# Altium footprint library Connector_art.PcbLib: 209 footprints (part 1 of 14)
Each footprint in its own frame and in the unit in brackets; x right, y up, seen from the top. Pads: shape width x height; smd on the part's side, far side on the other; paste and mask are expansions set on the pad; w line width, h text height; cw(c..) or ccw(c..) is an arc to the next point about the centre after c.
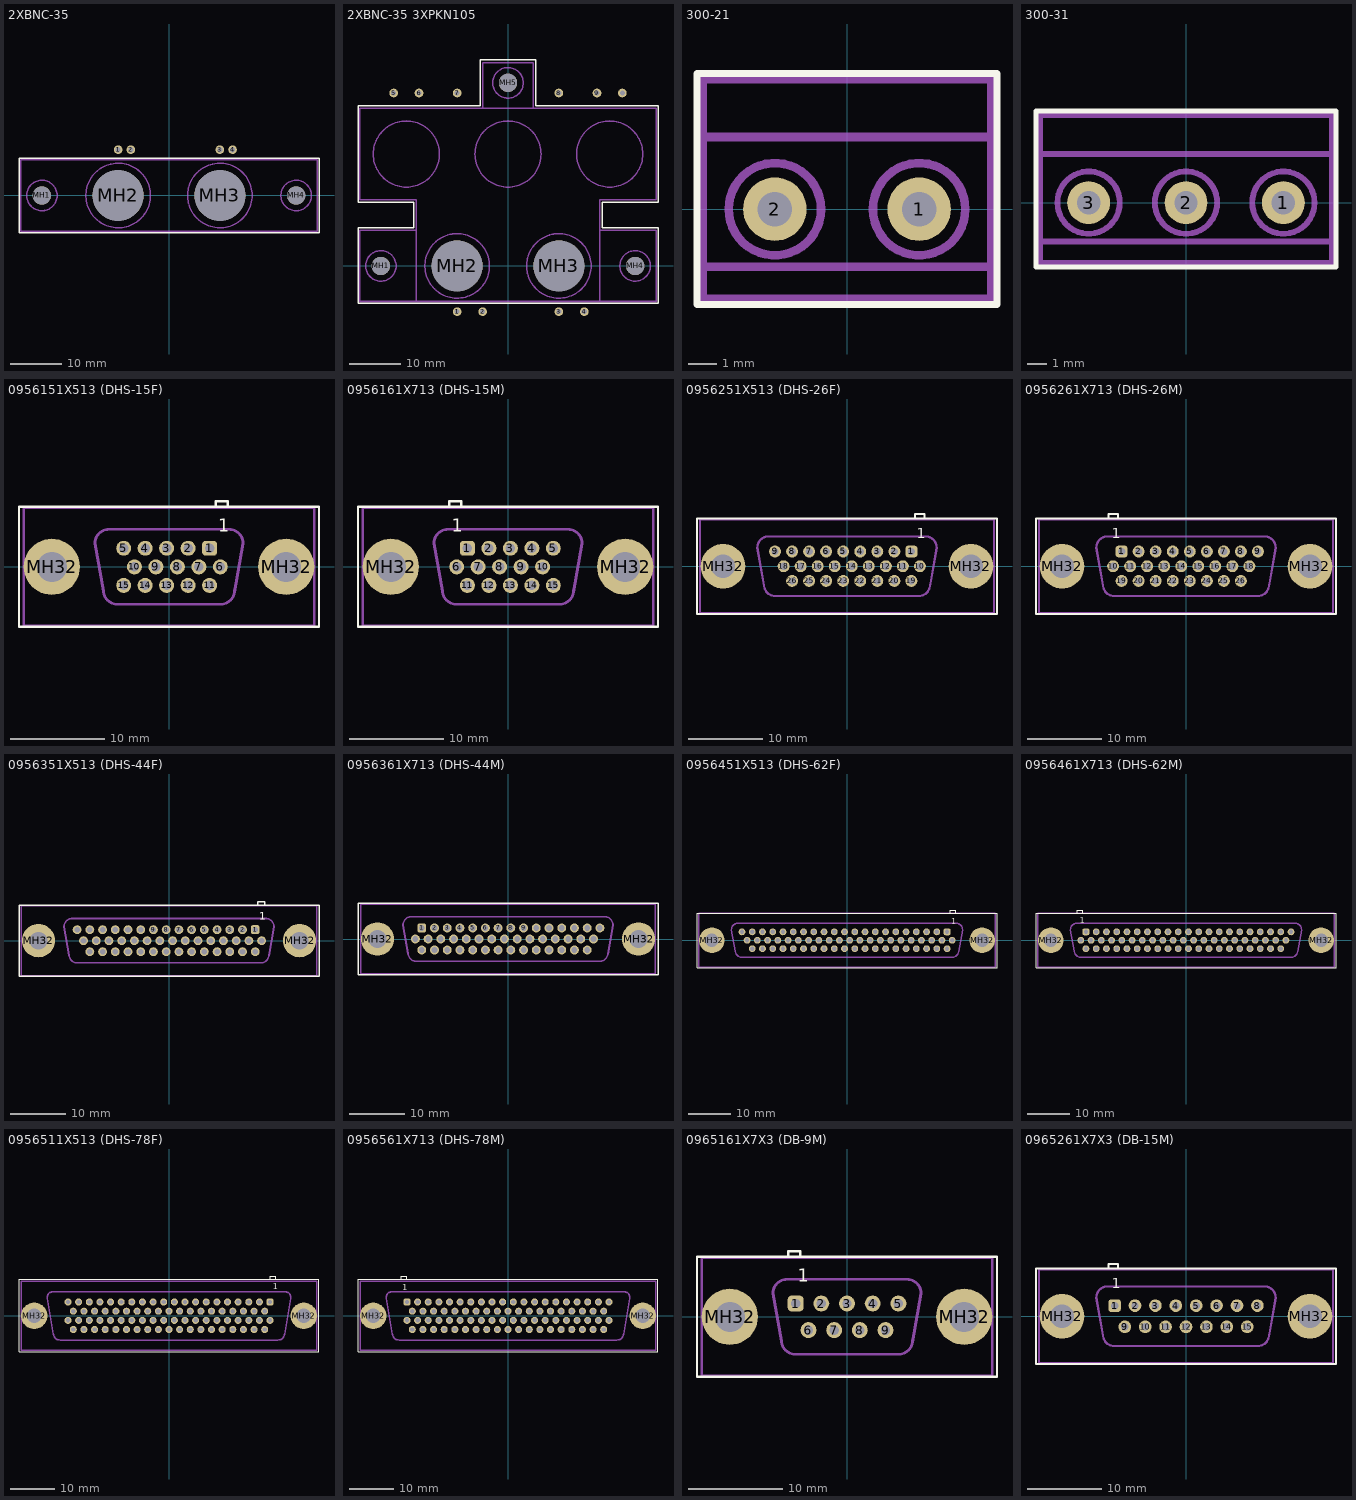
[diagram p0: the footprints below, top view; thin cyan lines are the x and y axes]

## 2XBNC-35 [mm]
height 18
pads (8):
  round 1.7 hole 1: 1(-10,9) 2(-7.5,9) 3(10,9) 4(12.5,9)
  round 3.6 hole 3.6 unplated: MH1(-25,0) MH4(25,0)
  round 10 hole 10 unplated: MH2(-10,0) MH3(10,0)
Top Overlay:
  lines w0.25: -29.5,-7.3 -29.5,7.3 29.5,7.3 29.5,-7.3 -29.5,-7.3
Mechanical 1:
  circle w0.3: c-10,0 r6.35
  circle w0.3: c10,0 r6.35
  circle w0.3: c-25,0 r3
  circle w0.3: c25,0 r3
  lines w0.3: -29.2,-7 29.2,-7 29.2,7 -29.2,7 -29.2,-7
3D body: height 18, standoff -9.6, extent -29.204,-6.997 29.196,7.003

## 2XBNC-35 3XPKN105 [mm]
height 18
pads (15):
  round 1.7 hole 1: 1(-10,-9) 2(-5,-9) 3(10,-9) 4(15,-9) 5(-22.5,34) 6(-17.5,34) 7(-10,34) 8(10,34) 9(17.5,34) 10(22.5,34)
  round 3.6 hole 3.6 unplated: MH1(-25,0) MH4(25,0) MH5(0,36)
  round 10 hole 10 unplated: MH2(-10,0) MH3(10,0)
Top Overlay:
  lines w0.25: -29.5,-7.3 29.5,-7.3 29.5,7.5 18.5,7.5 18.5,12.5 29.5,12.5 29.5,31.5 5.5,31.5 5.5,40.5 -5.5,40.5 -5.5,31.5 -29.5,31.5 -29.5,12.5 -18.5,12.5 -18.5,7.5 -29.5,7.5 -29.5,-7.3
Bottom Overlay:
  circle w0.25: c-10,-9 r1.25
  circle w0.25: c-5,-9 r1.25
  circle w0.25: c10,-9 r1.25
  circle w0.25: c15,-9 r1.25
  circle w0.25: c22.5,34 r1.25
  circle w0.25: c17.5,34 r1.25
  circle w0.25: c10,34 r1.25
  circle w0.25: c-22.5,34 r1.25
  circle w0.25: c-17.5,34 r1.25
  circle w0.25: c-10,34 r1.25
Mechanical 1:
  circle w0.3: c-10,0 r6.35
  circle w0.3: c10,0 r6.35
  circle w0.3: c-25,0 r3
  circle w0.3: c25,0 r3
  circle w0.3: c0,36 r3
  circle w0.3: c0,22 r6.5
  circle w0.3: c-20,22 r6.5
  circle w0.3: c20,22 r6.5
  lines w0.3: -18,-7 -18,13 -29.2,13 -29.2,31 29.2,31 29.2,13 18,13 18,-7 ; -18,7 -29.2,7 -29.2,-7 29.2,-7 29.2,7 18,7 ; -5,31 -5,40 5,40 5,31
3D body: height 18, standoff -15.8, extent -29.204,-6.997 29.196,40.203

## 300-21 [mm]
height 10
pads (2):
  round 2.2 hole 1.2: 1(2.5,0) 2(-2.5,0)
Top Overlay:
  lines w0.25: -5.2,-3.3 5.2,-3.3 5.2,4.7 -5.2,4.7 -5.2,-3.3
Mechanical 1:
  circle w0.3: c2.5,0 r1.6
  circle w0.3: c-2.5,0 r1.6
  lines w0.3: -5,-2 5,-2 ; -5,2.5 5,2.5 ; -5,-3.1 5,-3.1 5,4.5 -5,4.5 -5,-3.1
3D body: height 10, standoff -4.5, extent -5,-3.1 5,4.5

## 300-31 [mm]
height 10
pads (3):
  round 2.2 hole 1.2: 1(5,0) 2(0,0) 3(-5,0)
Top Overlay:
  lines w0.25: -7.7,-3.3 7.7,-3.3 7.7,4.7 -7.7,4.7 -7.7,-3.3
Mechanical 1:
  circle w0.3: c0,0 r1.6
  circle w0.3: c-5,0 r1.6
  circle w0.3: c5,0 r1.6
  lines w0.3: -7.5,-2 7.5,-2 ; -7.5,2.5 7.5,2.5 ; -7.5,-3.1 7.5,-3.1 7.5,4.5 -7.5,4.5 -7.5,-3.1
3D body: height 10, standoff -4.5, extent -7.5,-3.1 7.5,4.5

## 0956151X513 (DHS-15F) [mm]
pads (17):
  rrect50% 1.6x1.6 hole 1: 1(4.33,1.98)
  round 1.6 hole 1: 2(2.04,1.98) 3(-0.25,1.98) 4(-2.54,1.98) 5(-4.83,1.98) 6(5.47,0) 7(3.18,0) 8(0.89,0) 9(-1.4,0) 10(-3.69,0) 11(4.33,-1.98) 12(2.04,-1.98) 13(-0.25,-1.98) 14(-2.54,-1.98) 15(-4.83,-1.98)
  round 6 hole 3.2: MH32(-12.5,0) MH32(12.5,0)
Top Overlay:
  lines w0.25: 5,6.4 5,7 6.25,7 6.25,6.4 ; -16,-6.4 16,-6.4 16,6.4 -16,6.4 -16,-6.4
  text "1" at 5.25,3.75 h1.38
Mechanical 1:
  circle w0.3: c-1.4,0 r0.5
  circle w0.3: c-2.54,-1.98 r0.5
  circle w0.3: c-2.54,1.98 r0.5
  circle w0.3: c5.47,0 r0.5
  circle w0.3: c4.33,-1.98 r0.5
  circle w0.3: c4.33,1.98 r0.5
  circle w0.3: c3.18,0 r0.5
  circle w0.3: c2.04,-1.98 r0.5
  circle w0.3: c2.04,1.98 r0.5
  circle w0.3: c-0.25,1.98 r0.5
  circle w0.3: c12.5,0 r1.5
  circle w0.3: c-12.5,0 r1.5
  circle w0.3: c-0.25,-1.98 r0.5
  circle w0.3: c0.89,0 r0.5
  circle w0.3: c-4.83,1.98 r0.5
  circle w0.3: c-4.83,-1.98 r0.5
  circle w0.3: c-3.69,0 r0.5
  lines w0.1: -15,0 -10,0 ; -12.5,-2.5 -12.5,2.5 ; 10,0 15,0 ; 12.5,-2.5 12.5,2.5
  lines w0.3: -7,-2.6 -7.9,2.5 cw(c-6.4,2.5) -6.4,4 6.4,4 cw(c6.4,2.5) 7.9,2.5 7,-2.7 ; -7,-2.5 ccw(c-5.5,-2.5) -5.5,-4 5.5,-4 ccw(c5.5,-2.5) 7,-2.5 ; -15.5,-6.3 15.5,-6.3 15.5,6.3 -15.5,6.3 -15.5,-6.3
  text "10" at -6.25,-0.75 h2.12
  text "6" at 6.25,-0.5 h2.12
  text "11" at 5.25,-2.75 h2.12
  text "15" at -6.75,-2.75 h2.12
  text "1" at 5.75,1.5 h2.12
  text "5" at -7,1.25 h2.12

## 0956161X713 (DHS-15M) [mm]
pads (17):
  rrect50% 1.6x1.6 hole 1: 1(-4.33,1.98)
  round 1.6 hole 1: 2(-2.04,1.98) 3(0.25,1.98) 4(2.54,1.98) 5(4.83,1.98) 6(-5.47,0) 7(-3.18,0) 8(-0.89,0) 9(1.4,0) 10(3.69,0) 11(-4.33,-1.98) 12(-2.04,-1.98) 13(0.25,-1.98) 14(2.54,-1.98) 15(4.83,-1.98)
  round 6 hole 3.2: MH32(-12.5,0) MH32(12.5,0)
Top Overlay:
  lines w0.25: -6.25,6.4 -6.25,7 -5,7 -5,6.4 ; -16,-6.4 -16,6.4 16,6.4 16,-6.4 -16,-6.4
  text "1" at -6,3.75 h1.38
Mechanical 1:
  circle w0.3: c-5.47,0 r0.5
  circle w0.3: c-4.33,1.98 r0.5
  circle w0.3: c-4.33,-1.98 r0.5
  circle w0.3: c-3.18,0 r0.5
  circle w0.3: c-2.04,1.98 r0.5
  circle w0.3: c-2.04,-1.98 r0.5
  circle w0.3: c3.69,0 r0.5
  circle w0.3: c4.83,1.98 r0.5
  circle w0.3: c4.83,-1.98 r0.5
  circle w0.3: c1.4,0 r0.5
  circle w0.3: c2.54,1.98 r0.5
  circle w0.3: c2.54,-1.98 r0.5
  circle w0.3: c0.25,-1.98 r0.5
  circle w0.3: c-12.5,0 r1.5
  circle w0.3: c12.5,0 r1.5
  circle w0.3: c0.25,1.98 r0.5
  circle w0.3: c-0.89,0 r0.5
  lines w0.1: -15,0 -10,0 ; -12.5,-2.5 -12.5,2.5 ; 10,0 15,0 ; 12.5,-2.5 12.5,2.5
  lines w0.3: -7,-2.6 -7.9,2.5 cw(c-6.4,2.5) -6.4,4 6.4,4 cw(c6.4,2.5) 7.9,2.5 7,-2.7 ; -7,-2.5 ccw(c-5.5,-2.5) -5.5,-4 5.5,-4 ccw(c5.5,-2.5) 7,-2.5 ; -15.5,-6.3 -15.5,6.3 15.5,6.3 15.5,-6.3 -15.5,-6.3
  text "5" at 6,1.5 h2.12
  text "1" at -7.25,1.75 h2.12
  text "15" at 5,-3.5 h2.12
  text "11" at -6.75,-2.75 h2.12
  text "6" at -7,-0.5 h2.12
  text "10" at 4.75,-0.75 h2.12

## 0956251X513 (DHS-26F) [mm]
pads (28):
  rrect50% 1.6x1.6 hole 1: 1(8.65,1.98)
  round 1.6 hole 1: 2(6.36,1.98) 3(4.07,1.98) 4(1.78,1.98) 5(-0.51,1.98) 6(-2.8,1.98) 7(-5.09,1.98) 8(-7.38,1.98) 9(-9.67,1.98) 10(9.8,0) 11(7.51,0) 12(5.22,0) 13(2.93,0) 14(0.64,0) 15(-1.65,0) 16(-3.94,0) 17(-6.23,0) 18(-8.52,0) 19(8.65,-1.98) 20(6.36,-1.98) 21(4.07,-1.98) 22(1.78,-1.98) 23(-0.51,-1.98) 24(-2.8,-1.98) 25(-5.09,-1.98) 26(-7.38,-1.98)
  round 6 hole 3.2: MH32(-16.65,0) MH32(16.65,0)
Top Overlay:
  lines w0.25: 9.15,6.4 9.15,7 10.4,7 10.4,6.4 ; -20.15,-6.4 20.15,-6.4 20.15,6.4 -20.15,6.4 -20.15,-6.4
  text "1" at 9.4,3.75 h1.38
Mechanical 1:
  circle w0.3: c16.65,0 r1.5
  circle w0.3: c-16.65,0 r1.5
  circle w0.3: c0.64,0 r0.5
  circle w0.3: c-0.51,1.98 r0.5
  circle w0.3: c-0.51,-1.98 r0.5
  circle w0.3: c1.78,-1.98 r0.5
  circle w0.3: c1.78,1.98 r0.5
  circle w0.3: c2.93,0 r0.5
  circle w0.3: c4.07,-1.98 r0.5
  circle w0.3: c4.07,1.98 r0.5
  circle w0.3: c5.22,0 r0.5
  circle w0.3: c6.36,-1.98 r0.5
  circle w0.3: c6.36,1.98 r0.5
  circle w0.3: c7.51,0 r0.5
  circle w0.3: c8.65,-1.98 r0.5
  circle w0.3: c8.65,1.98 r0.5
  circle w0.3: c9.8,0 r0.5
  circle w0.3: c-2.8,-1.98 r0.5
  circle w0.3: c-2.8,1.98 r0.5
  circle w0.3: c-1.65,0 r0.5
  circle w0.3: c-5.09,-1.98 r0.5
  circle w0.3: c-5.09,1.98 r0.5
  circle w0.3: c-3.94,0 r0.5
  circle w0.3: c-7.38,-1.98 r0.5
  circle w0.3: c-7.38,1.98 r0.5
  circle w0.3: c-6.23,0 r0.5
  circle w0.3: c-9.67,1.98 r0.5
  circle w0.3: c-8.52,0 r0.5
  lines w0.1: -19.15,0 -14.15,0 ; -16.65,-2.5 -16.65,2.5 ; 14.15,0 19.15,0 ; 16.65,-2.5 16.65,2.5
  lines w0.3: -11.15,-2.6 -12.05,2.5 cw(c-10.55,2.5) -10.55,4 10.55,4 cw(c10.55,2.5) 12.05,2.5 11.15,-2.7 ; -11.15,-2.5 ccw(c-9.65,-2.5) -9.65,-4 9.65,-4 ccw(c9.65,-2.5) 11.15,-2.5 ; -19.75,-6.3 19.75,-6.3 19.75,6.3 -19.75,6.3 -19.75,-6.3
  text "18" at -11.25,-0.75 h2.12
  text "19" at 9.25,-2.75 h2.12
  text "26" at -10.25,-2.75 h2.12
  text "1" at 10,1.5 h2.12
  text "9" at -11.5,1.5 h2.12

## 0956261X713 (DHS-26M) [mm]
pads (28):
  rrect50% 1.6x1.6 hole 1: 1(-8.65,1.98)
  round 1.6 hole 1: 2(-6.36,1.98) 3(-4.07,1.98) 4(-1.78,1.98) 5(0.51,1.98) 6(2.8,1.98) 7(5.09,1.98) 8(7.38,1.98) 9(9.67,1.98) 10(-9.8,0) 11(-7.51,0) 12(-5.22,0) 13(-2.93,0) 14(-0.64,0) 15(1.65,0) 16(3.94,0) 17(6.23,0) 18(8.52,0) 19(-8.65,-1.98) 20(-6.36,-1.98) 21(-4.07,-1.98) 22(-1.78,-1.98) 23(0.51,-1.98) 24(2.8,-1.98) 25(5.09,-1.98) 26(7.38,-1.98)
  round 6 hole 3.2: MH32(-16.65,0) MH32(16.65,0)
Top Overlay:
  lines w0.25: -10.4,6.4 -10.4,7 -9.15,7 -9.15,6.4 ; -20.15,-6.4 20.15,-6.4 20.15,6.4 -20.15,6.4 -20.15,-6.4
  text "1" at -10,3.75 h1.38
Mechanical 1:
  circle w0.3: c16.65,0 r1.5
  circle w0.3: c-16.65,0 r1.5
  circle w0.3: c-0.64,0 r0.5
  circle w0.3: c0.51,1.98 r0.5
  circle w0.3: c0.51,-1.98 r0.5
  circle w0.3: c-1.78,-1.98 r0.5
  circle w0.3: c-1.78,1.98 r0.5
  circle w0.3: c-2.93,0 r0.5
  circle w0.3: c-4.07,-1.98 r0.5
  circle w0.3: c-4.07,1.98 r0.5
  circle w0.3: c-5.22,0 r0.5
  circle w0.3: c-6.36,-1.98 r0.5
  circle w0.3: c-6.36,1.98 r0.5
  circle w0.3: c-7.51,0 r0.5
  circle w0.3: c-8.65,-1.98 r0.5
  circle w0.3: c-8.65,1.98 r0.5
  circle w0.3: c-9.8,0 r0.5
  circle w0.3: c2.8,-1.98 r0.5
  circle w0.3: c2.8,1.98 r0.5
  circle w0.3: c1.65,0 r0.5
  circle w0.3: c5.09,-1.98 r0.5
  circle w0.3: c5.09,1.98 r0.5
  circle w0.3: c3.94,0 r0.5
  circle w0.3: c7.38,-1.98 r0.5
  circle w0.3: c7.38,1.98 r0.5
  circle w0.3: c6.23,0 r0.5
  circle w0.3: c9.67,1.98 r0.5
  circle w0.3: c8.52,0 r0.5
  lines w0.1: -19.15,0 -14.15,0 ; -16.65,-2.5 -16.65,2.5 ; 14.15,0 19.15,0 ; 16.65,-2.5 16.65,2.5
  lines w0.3: -11.15,-2.6 -12.05,2.5 cw(c-10.55,2.5) -10.55,4 10.55,4 cw(c10.55,2.5) 12.05,2.5 11.15,-2.7 ; -11.15,-2.5 ccw(c-9.65,-2.5) -9.65,-4 9.65,-4 ccw(c9.65,-2.5) 11.15,-2.5 ; -19.75,-6.3 19.75,-6.3 19.75,6.3 -19.75,6.3 -19.75,-6.3
  text "18" at 9.5,-0.75 h2.12
  text "19" at -10.5,-3.5 h2.12
  text "26" at 8.25,-3.5 h2.12
  text "1" at -10.5,1.5 h2.12
  text "9" at 10.75,2 h2.12

## 0956351X513 (DHS-44F) [mm]
pads (46):
  rrect50% 1.6x1.6 hole 1: 1(15.52,1.98)
  round 1.6 hole 1: 2(13.23,1.98) 3(10.94,1.98) 4(8.65,1.98) 5(6.36,1.98) 6(4.07,1.98) 7(1.78,1.98) 8(-0.51,1.98) 9(-2.8,1.98) 10(-5.09,1.98) 11(-7.38,1.98) 12(-9.67,1.98) 13(-11.96,1.98) 14(-14.25,1.98) 15(-16.54,1.98) 16(16.67,0) 17(14.38,0) 18(12.09,0) 19(9.8,0) 20(7.51,0) 21(5.22,0) 22(2.93,0) 23(0.64,0) 24(-1.65,0) 25(-3.94,0) 26(-6.23,0) 27(-8.52,0) 28(-10.81,0) 29(-13.1,0) 30(-15.39,0) 31(15.52,-1.98) 32(13.23,-1.98) 33(10.94,-1.98) 34(8.65,-1.98) 35(6.36,-1.98) 36(4.07,-1.98) 37(1.78,-1.98) 38(-0.51,-1.98) 39(-2.8,-1.98) 40(-5.09,-1.98) 41(-7.38,-1.98) 42(-9.67,-1.98) 43(-11.96,-1.98) 44(-14.25,-1.98)
  round 6 hole 3.2: MH32(-23.5,0) MH32(23.5,0)
Top Overlay:
  lines w0.25: 16,6.4 16,7 17.25,7 17.25,6.4 ; -27,-6.4 27,-6.4 27,6.4 -27,6.4 -27,-6.4
  text "1" at 16.25,3.75 h1.38
Mechanical 1:
  circle w0.3: c-15.39,0 r0.5
  circle w0.3: c-16.54,1.98 r0.5
  circle w0.3: c16.67,0 r0.5
  circle w0.3: c15.52,1.98 r0.5
  circle w0.3: c15.52,-1.98 r0.5
  circle w0.3: c23.5,0 r1.5
  circle w0.3: c-23.5,0 r1.5
  circle w0.3: c0.64,0 r0.5
  circle w0.3: c-0.51,1.98 r0.5
  circle w0.3: c-0.51,-1.98 r0.5
  circle w0.3: c1.78,-1.98 r0.5
  circle w0.3: c1.78,1.98 r0.5
  circle w0.3: c2.93,0 r0.5
  circle w0.3: c4.07,-1.98 r0.5
  circle w0.3: c4.07,1.98 r0.5
  circle w0.3: c5.22,0 r0.5
  circle w0.3: c6.36,-1.98 r0.5
  circle w0.3: c6.36,1.98 r0.5
  circle w0.3: c7.51,0 r0.5
  circle w0.3: c8.65,-1.98 r0.5
  circle w0.3: c8.65,1.98 r0.5
  circle w0.3: c9.8,0 r0.5
  circle w0.3: c10.94,-1.98 r0.5
  circle w0.3: c10.94,1.98 r0.5
  circle w0.3: c12.09,0 r0.5
  circle w0.3: c13.23,-1.98 r0.5
  circle w0.3: c13.23,1.98 r0.5
  circle w0.3: c14.38,0 r0.5
  circle w0.3: c-2.8,-1.98 r0.5
  circle w0.3: c-2.8,1.98 r0.5
  circle w0.3: c-1.65,0 r0.5
  circle w0.3: c-5.09,-1.98 r0.5
  circle w0.3: c-5.09,1.98 r0.5
  circle w0.3: c-3.94,0 r0.5
  circle w0.3: c-7.38,-1.98 r0.5
  circle w0.3: c-7.38,1.98 r0.5
  circle w0.3: c-6.23,0 r0.5
  circle w0.3: c-9.67,-1.98 r0.5
  circle w0.3: c-9.67,1.98 r0.5
  circle w0.3: c-8.52,0 r0.5
  circle w0.3: c-11.96,-1.98 r0.5
  circle w0.3: c-11.96,1.98 r0.5
  circle w0.3: c-10.81,0 r0.5
  circle w0.3: c-14.25,-1.98 r0.5
  circle w0.3: c-14.25,1.98 r0.5
  circle w0.3: c-13.1,0 r0.5
  lines w0.1: -26,0 -21,0 ; -23.5,-2.5 -23.5,2.5 ; 21,0 26,0 ; 23.5,-2.5 23.5,2.5
  lines w0.3: -18,-2.6 -18.9,2.5 cw(c-17.4,2.5) -17.4,4 17.4,4 cw(c17.4,2.5) 18.9,2.5 18,-2.7 ; -18,-2.5 ccw(c-16.5,-2.5) -16.5,-4 16.5,-4 ccw(c16.5,-2.5) 18,-2.5 ; -26.6,-6.3 26.6,-6.3 26.6,6.3 -26.6,6.3 -26.6,-6.3
  text "30" at -18,-0.75 h2.12
  text "31" at 16.25,-2.75 h2.12
  text "44" at -17,-2.75 h2.12
  text "1" at 16.75,1.5 h2.12
  text "15" at -18.5,2.25 h2.12

## 0956361X713 (DHS-44M) [mm]
height 12
pads (46):
  rrect50% 1.6x1.6 hole 1: 1(-15.52,1.98)
  round 1.6 hole 1: 2(-13.23,1.98) 3(-10.94,1.98) 4(-8.65,1.98) 5(-6.36,1.98) 6(-4.07,1.98) 7(-1.78,1.98) 8(0.51,1.98) 9(2.8,1.98) 10(5.09,1.98) 11(7.38,1.98) 12(9.67,1.98) 13(11.96,1.98) 14(14.25,1.98) 15(16.54,1.98) 16(-16.67,0) 17(-14.38,0) 18(-12.09,0) 19(-9.8,0) 20(-7.51,0) 21(-5.22,0) 22(-2.93,0) 23(-0.64,0) 24(1.65,0) 25(3.94,0) 26(6.23,0) 27(8.52,0) 28(10.81,0) 29(13.1,0) 30(15.39,0) 31(-15.52,-1.98) 32(-13.23,-1.98) 33(-10.94,-1.98) 34(-8.65,-1.98) 35(-6.36,-1.98) 36(-4.07,-1.98) 37(-1.78,-1.98) 38(0.51,-1.98) 39(2.8,-1.98) 40(5.09,-1.98) 41(7.38,-1.98) 42(9.67,-1.98) 43(11.96,-1.98) 44(14.25,-1.98)
  round 6 hole 3.2: MH32(-23.5,0) MH32(23.5,0)
Top Overlay:
  lines w0.25: -27,-6.4 -27,6.4 27,6.4 27,-6.4 -27,-6.4
Mechanical 1:
  circle w0.3: c14.25,-1.98 r0.5
  circle w0.3: c11.96,-1.98 r0.5
  circle w0.3: c9.67,-1.98 r0.5
  circle w0.3: c7.38,-1.98 r0.5
  circle w0.3: c5.09,-1.98 r0.5
  circle w0.3: c2.8,-1.98 r0.5
  circle w0.3: c0.51,-1.98 r0.5
  circle w0.3: c-1.78,-1.98 r0.5
  circle w0.3: c-4.07,-1.98 r0.5
  circle w0.3: c-6.36,-1.98 r0.5
  circle w0.3: c-8.65,-1.98 r0.5
  circle w0.3: c-10.94,-1.98 r0.5
  circle w0.3: c-13.23,-1.98 r0.5
  circle w0.3: c-15.52,-1.98 r0.5
  circle w0.3: c-16.67,0 r0.5
  circle w0.3: c-14.38,0 r0.5
  circle w0.3: c-12.09,0 r0.5
  circle w0.3: c-9.8,0 r0.5
  circle w0.3: c-7.51,0 r0.5
  circle w0.3: c-5.22,0 r0.5
  circle w0.3: c-2.93,0 r0.5
  circle w0.3: c-0.64,0 r0.5
  circle w0.3: c1.65,0 r0.5
  circle w0.3: c3.94,0 r0.5
  circle w0.3: c6.23,0 r0.5
  circle w0.3: c8.52,0 r0.5
  circle w0.3: c10.81,0 r0.5
  circle w0.3: c13.1,0 r0.5
  circle w0.3: c15.39,0 r0.5
  circle w0.3: c16.54,1.98 r0.5
  circle w0.3: c14.25,1.98 r0.5
  circle w0.3: c11.96,1.98 r0.5
  circle w0.3: c9.67,1.98 r0.5
  circle w0.3: c7.38,1.98 r0.5
  circle w0.3: c5.09,1.98 r0.5
  circle w0.3: c2.8,1.98 r0.5
  circle w0.3: c0.51,1.98 r0.5
  circle w0.3: c-1.78,1.98 r0.5
  circle w0.3: c-4.07,1.98 r0.5
  circle w0.3: c-6.36,1.98 r0.5
  circle w0.3: c-8.65,1.98 r0.5
  circle w0.3: c-10.94,1.98 r0.5
  circle w0.3: c-13.23,1.98 r0.5
  circle w0.3: c-15.52,1.98 r0.5
  circle w0.3: c-23.5,0 r1.5
  circle w0.3: c23.5,0 r1.5
  lines w0.025: -26,0 -21,0 ; -23.5,-2.5 -23.5,2.5 ; 21,0 26,0 ; 23.5,-2.5 23.5,2.5
  lines w0.3: -18,-2.6 -18.9,2.5 cw(c-17.4,2.5) -17.4,4 17.4,4 cw(c17.4,2.5) 18.9,2.5 18,-2.7 ; -18,-2.5 ccw(c-16.5,-2.5) -16.5,-4 ; -16.6,-4 16.5,-4 ccw(c16.5,-2.5) 18,-2.5 ; -26.5,-6.3 -26.5,6.3 26.5,6.3 26.5,-6.3 -26.5,-6.3
  text "30" at 16.5,-0.75 h2.12
  text "1" at -17.25,1.5 h2.12
  text "15" at 17.04,1.98 h2.12
  text "31" at -17.5,-3.5 h2.12
  text "44" at 15.5,-2.75 h2.12
3D body: height 12.99, standoff -3.5, extent -26.518,-6.274 26.518,6.274

## 0956451X513 (DHS-62F) [mm]
pads (64):
  rrect50% 1.6x1.6 hole 1: 1(23.52,1.98)
  round 1.6 hole 1: 2(21.11,1.98) 3(18.7,1.98) 4(16.29,1.98) 5(13.88,1.98) 6(11.47,1.98) 7(9.06,1.98) 8(6.65,1.98) 9(4.24,1.98) 10(1.83,1.98) 11(-0.58,1.98) 12(-2.99,1.98) 13(-5.4,1.98) 14(-7.81,1.98) 15(-10.22,1.98) 16(-12.63,1.98) 17(-15.04,1.98) 18(-17.45,1.98) 19(-19.86,1.98) 20(-22.27,1.98) 21(-24.68,1.98) 22(24.72,0) 23(22.31,0) 24(19.9,0) 25(17.49,0) 26(15.08,0) 27(12.67,0) 28(10.26,0) 29(7.85,0) 30(5.44,0) 31(3.03,0) 32(0.62,0) 33(-1.79,0) 34(-4.2,0) 35(-6.61,0) 36(-9.02,0) 37(-11.43,0) 38(-13.84,0) 39(-16.25,0) 40(-18.66,0) 41(-21.07,0) 42(-23.48,0) 43(23.52,-1.98) 44(21.11,-1.98) 45(18.7,-1.98) 46(16.29,-1.98) 47(13.88,-1.98) 48(11.47,-1.98) 49(9.06,-1.98) 50(6.65,-1.98) 51(4.24,-1.98) 52(1.83,-1.98) 53(-0.58,-1.98) 54(-2.99,-1.98) 55(-5.4,-1.98) 56(-7.81,-1.98) 57(-10.22,-1.98) 58(-12.63,-1.98) 59(-15.04,-1.98) 60(-17.45,-1.98) 61(-19.86,-1.98) 62(-22.27,-1.98)
  round 6 hole 3.2: MH32(-31.75,0) MH32(31.75,0)
Top Overlay:
  lines w0.25: 24.25,6.4 24.25,7 25.5,7 25.5,6.4 ; -35.25,-6.4 35.25,-6.4 35.25,6.4 -35.25,6.4 -35.25,-6.4
  text "1" at 24.5,3.75 h1.38
Mechanical 1:
  circle w0.3: c31.75,0 r1.5
  circle w0.3: c-31.75,0 r1.5
  circle w0.3: c0.62,0 r0.5
  circle w0.3: c-0.58,-1.98 r0.5
  circle w0.3: c1.83,-1.98 r0.5
  circle w0.3: c1.83,1.98 r0.5
  circle w0.3: c3.03,0 r0.5
  circle w0.3: c4.24,-1.98 r0.5
  circle w0.3: c4.24,1.98 r0.5
  circle w0.3: c5.44,0 r0.5
  circle w0.3: c6.65,-1.98 r0.5
  circle w0.3: c6.65,1.98 r0.5
  circle w0.3: c7.85,0 r0.5
  circle w0.3: c9.06,-1.98 r0.5
  circle w0.3: c9.06,1.98 r0.5
  circle w0.3: c10.26,0 r0.5
  circle w0.3: c11.47,-1.98 r0.5
  circle w0.3: c11.47,1.98 r0.5
  circle w0.3: c12.67,0 r0.5
  circle w0.3: c13.88,-1.98 r0.5
  circle w0.3: c13.88,1.98 r0.5
  circle w0.3: c15.08,0 r0.5
  circle w0.3: c16.29,-1.98 r0.5
  circle w0.3: c16.29,1.98 r0.5
  circle w0.3: c17.49,0 r0.5
  circle w0.3: c18.7,-1.98 r0.5
  circle w0.3: c18.7,1.98 r0.5
  circle w0.3: c19.9,0 r0.5
  circle w0.3: c21.11,-1.98 r0.5
  circle w0.3: c21.11,1.98 r0.5
  circle w0.3: c22.31,0 r0.5
  circle w0.3: c23.52,-1.98 r0.5
  circle w0.3: c23.52,1.98 r0.5
  circle w0.3: c24.72,0 r0.5
  circle w0.3: c-0.58,1.98 r0.5
  circle w0.3: c-2.99,-1.98 r0.5
  circle w0.3: c-2.99,1.98 r0.5
  circle w0.3: c-1.79,0 r0.5
  circle w0.3: c-5.4,-1.98 r0.5
  circle w0.3: c-5.4,1.98 r0.5
  circle w0.3: c-4.2,0 r0.5
  circle w0.3: c-7.81,-1.98 r0.5
  circle w0.3: c-7.81,1.98 r0.5
  circle w0.3: c-6.61,0 r0.5
  circle w0.3: c-10.22,-1.98 r0.5
  circle w0.3: c-10.22,1.98 r0.5
  circle w0.3: c-9.02,0 r0.5
  circle w0.3: c-12.63,-1.98 r0.5
  circle w0.3: c-12.63,1.98 r0.5
  circle w0.3: c-11.43,0 r0.5
  circle w0.3: c-15.04,-1.98 r0.5
  circle w0.3: c-15.04,1.98 r0.5
  circle w0.3: c-13.84,0 r0.5
  circle w0.3: c-17.45,-1.98 r0.5
  circle w0.3: c-17.45,1.98 r0.5
  circle w0.3: c-16.25,0 r0.5
  circle w0.3: c-19.86,-1.98 r0.5
  circle w0.3: c-19.86,1.98 r0.5
  circle w0.3: c-18.66,0 r0.5
  circle w0.3: c-22.27,-1.98 r0.5
  circle w0.3: c-22.27,1.98 r0.5
  circle w0.3: c-21.07,0 r0.5
  circle w0.3: c-24.68,1.98 r0.5
  circle w0.3: c-23.48,0 r0.5
  lines w0.1: -34.25,0 -29.25,0 ; -31.75,-2.5 -31.75,2.5 ; 29.25,0 34.25,0 ; 31.75,-2.5 31.75,2.5
  lines w0.3: -26.25,-2.6 -27.15,2.5 cw(c-25.65,2.5) -25.65,4 25.65,4 cw(c25.65,2.5) 27.15,2.5 26.25,-2.7 ; -26.25,-2.5 ccw(c-24.75,-2.5) -24.75,-4 24.75,-4 ccw(c24.75,-2.5) 26.25,-2.5 ; -34.85,-6.3 34.85,-6.3 34.85,6.3 -34.85,6.3 -34.85,-6.3
  text "42" at -26,-0.75 h2.12
  text "43" at 24.25,-3 h2.12
  text "62" at -25,-2.75 h2.12
  text "1" at 24.75,1.5 h2.12
  text "21" at -26.75,2.25 h2.12
3D body: height 13.25, standoff -3.5, extent -34.897,-6.469 34.903,6.461

## 0956461X713 (DHS-62M) [mm]
pads (64):
  rrect50% 1.6x1.6 hole 1: 1(-23.52,1.98)
  round 1.6 hole 1: 2(-21.11,1.98) 3(-18.7,1.98) 4(-16.29,1.98) 5(-13.88,1.98) 6(-11.47,1.98) 7(-9.06,1.98) 8(-6.65,1.98) 9(-4.24,1.98) 10(-1.83,1.98) 11(0.58,1.98) 12(2.99,1.98) 13(5.4,1.98) 14(7.81,1.98) 15(10.22,1.98) 16(12.63,1.98) 17(15.04,1.98) 18(17.45,1.98) 19(19.86,1.98) 20(22.27,1.98) 21(24.68,1.98) 22(-24.72,0) 23(-22.31,0) 24(-19.9,0) 25(-17.49,0) 26(-15.08,0) 27(-12.67,0) 28(-10.26,0) 29(-7.85,0) 30(-5.44,0) 31(-3.03,0) 32(-0.62,0) 33(1.79,0) 34(4.2,0) 35(6.61,0) 36(9.02,0) 37(11.43,0) 38(13.84,0) 39(16.25,0) 40(18.66,0) 41(21.07,0) 42(23.48,0) 43(-23.52,-1.98) 44(-21.11,-1.98) 45(-18.7,-1.98) 46(-16.29,-1.98) 47(-13.88,-1.98) 48(-11.47,-1.98) 49(-9.06,-1.98) 50(-6.65,-1.98) 51(-4.24,-1.98) 52(-1.83,-1.98) 53(0.58,-1.98) 54(2.99,-1.98) 55(5.4,-1.98) 56(7.81,-1.98) 57(10.22,-1.98) 58(12.63,-1.98) 59(15.04,-1.98) 60(17.45,-1.98) 61(19.86,-1.98) 62(22.27,-1.98)
  round 6 hole 3.2: MH32(-31.75,0) MH32(31.75,0)
Top Overlay:
  lines w0.25: -25.5,6.4 -25.5,7 -24.25,7 -24.25,6.4 ; -35.25,-6.4 35.25,-6.4 35.25,6.4 -35.25,6.4 -35.25,-6.4
  text "1" at -25,4 h1.38
Mechanical 1:
  circle w0.3: c31.75,0 r1.5
  circle w0.3: c-31.75,0 r1.5
  circle w0.3: c-0.62,0 r0.5
  circle w0.3: c0.58,-1.98 r0.5
  circle w0.3: c-1.83,-1.98 r0.5
  circle w0.3: c-1.83,1.98 r0.5
  circle w0.3: c-3.03,0 r0.5
  circle w0.3: c-4.24,-1.98 r0.5
  circle w0.3: c-4.24,1.98 r0.5
  circle w0.3: c-5.44,0 r0.5
  circle w0.3: c-6.65,-1.98 r0.5
  circle w0.3: c-6.65,1.98 r0.5
  circle w0.3: c-7.85,0 r0.5
  circle w0.3: c-9.06,-1.98 r0.5
  circle w0.3: c-9.06,1.98 r0.5
  circle w0.3: c-10.26,0 r0.5
  circle w0.3: c-11.47,-1.98 r0.5
  circle w0.3: c-11.47,1.98 r0.5
  circle w0.3: c-12.67,0 r0.5
  circle w0.3: c-13.88,-1.98 r0.5
  circle w0.3: c-13.88,1.98 r0.5
  circle w0.3: c-15.08,0 r0.5
  circle w0.3: c-16.29,-1.98 r0.5
  circle w0.3: c-16.29,1.98 r0.5
  circle w0.3: c-17.49,0 r0.5
  circle w0.3: c-18.7,-1.98 r0.5
  circle w0.3: c-18.7,1.98 r0.5
  circle w0.3: c-19.9,0 r0.5
  circle w0.3: c-21.11,-1.98 r0.5
  circle w0.3: c-21.11,1.98 r0.5
  circle w0.3: c-22.31,0 r0.5
  circle w0.3: c-23.52,-1.98 r0.5
  circle w0.3: c-23.52,1.98 r0.5
  circle w0.3: c-24.72,0 r0.5
  circle w0.3: c0.58,1.98 r0.5
  circle w0.3: c2.99,-1.98 r0.5
  circle w0.3: c2.99,1.98 r0.5
  circle w0.3: c1.79,0 r0.5
  circle w0.3: c5.4,-1.98 r0.5
  circle w0.3: c5.4,1.98 r0.5
  circle w0.3: c4.2,0 r0.5
  circle w0.3: c7.81,-1.98 r0.5
  circle w0.3: c7.81,1.98 r0.5
  circle w0.3: c6.61,0 r0.5
  circle w0.3: c10.22,-1.98 r0.5
  circle w0.3: c10.22,1.98 r0.5
  circle w0.3: c9.02,0 r0.5
  circle w0.3: c12.63,-1.98 r0.5
  circle w0.3: c12.63,1.98 r0.5
  circle w0.3: c11.43,0 r0.5
  circle w0.3: c15.04,-1.98 r0.5
  circle w0.3: c15.04,1.98 r0.5
  circle w0.3: c13.84,0 r0.5
  circle w0.3: c17.45,-1.98 r0.5
  circle w0.3: c17.45,1.98 r0.5
  circle w0.3: c16.25,0 r0.5
  circle w0.3: c19.86,-1.98 r0.5
  circle w0.3: c19.86,1.98 r0.5
  circle w0.3: c18.66,0 r0.5
  circle w0.3: c22.27,-1.98 r0.5
  circle w0.3: c22.27,1.98 r0.5
  circle w0.3: c21.07,0 r0.5
  circle w0.3: c24.68,1.98 r0.5
  circle w0.3: c23.48,0 r0.5
  lines w0.1: -34.25,0 -29.25,0 ; -31.75,-2.5 -31.75,2.5 ; 29.25,0 34.25,0 ; 31.75,-2.5 31.75,2.5
  lines w0.3: -26.25,-2.6 -27.15,2.5 cw(c-25.65,2.5) -25.65,4 25.65,4 cw(c25.65,2.5) 27.15,2.5 26.25,-2.7 ; -26.25,-2.5 ccw(c-24.75,-2.5) -24.75,-4 24.75,-4 ccw(c24.75,-2.5) 26.25,-2.5 ; -34.85,-6.3 34.85,-6.3 34.85,6.3 -34.85,6.3 -34.85,-6.3
  text "42" at 24.5,-0.75 h2.12
  text "43" at -25.75,-3.5 h2.12
  text "62" at 23.5,-2.75 h2.12
  text "1" at -25.75,1.5 h2.12
  text "21" at 25.18,1.98 h2.12

## 0956511X513 (DHS-78F) [mm]
pads (80):
  rrect50% 1.6x1.6 hole 1: 1(22.9,3.12)
  round 1.6 hole 1: 2(20.49,3.12) 3(18.08,3.12) 4(15.67,3.12) 5(13.26,3.12) 6(10.85,3.12) 7(8.44,3.12) 8(6.03,3.12) 9(3.62,3.12) 10(1.21,3.12) 11(-1.2,3.12) 12(-3.61,3.12) 13(-6.02,3.12) 14(-8.43,3.12) 15(-10.84,3.12) 16(-13.25,3.12) 17(-15.66,3.12) 18(-18.07,3.12) 19(-20.48,3.12) 20(-22.89,3.12) 21(21.69,1.04) 22(19.28,1.04) 23(16.87,1.04) 24(14.46,1.04) 25(12.05,1.04) 26(9.64,1.04) 27(7.23,1.04) 28(4.82,1.04) 29(2.41,1.04) 30(0,1.04) 31(-2.41,1.04) 32(-4.82,1.04) 33(-7.23,1.04) 34(-9.64,1.04) 35(-12.05,1.04) 36(-14.46,1.04) 37(-16.87,1.04) 38(-19.28,1.04) 39(-21.69,1.04) 40(22.9,-1.04) 41(20.49,-1.04) 42(18.08,-1.04) 43(15.67,-1.04) 44(13.26,-1.04) 45(10.85,-1.04) 46(8.44,-1.04) 47(6.03,-1.04) 48(3.62,-1.04) 49(1.21,-1.04) 50(-1.2,-1.04) 51(-3.61,-1.04) 52(-6.02,-1.04) 53(-8.43,-1.04) 54(-10.84,-1.04) 55(-13.25,-1.04) 56(-15.66,-1.04) 57(-18.07,-1.04) 58(-20.48,-1.04) 59(-22.89,-1.04) 60(21.69,-3.12) 61(19.28,-3.12) 62(16.87,-3.12) 63(14.46,-3.12) 64(12.05,-3.12) 65(9.64,-3.12) 66(7.23,-3.12) 67(4.82,-3.12) 68(2.41,-3.12) 69(0,-3.12) 70(-2.41,-3.12) 71(-4.82,-3.12) 72(-7.23,-3.12) 73(-9.64,-3.12) 74(-12.05,-3.12) 75(-14.46,-3.12) 76(-16.87,-3.12) 77(-19.28,-3.12) 78(-21.69,-3.12)
  round 6 hole 3.2: MH32(-30.55,0) MH32(30.55,0)
Top Overlay:
  lines w0.25: 23,8.3 23,9 24.25,9 24.25,8.3 ; -34,-8.2 -34,8.3 34,8.3 34,-8.2 -34,-8.2
  text "1" at 23.5,6 h1.38
Mechanical 1:
  circle w0.3: c30.55,0 r1.5
  circle w0.3: c-30.55,0 r1.5
  circle w0.3: c0,-3.12 r0.5
  circle w0.3: c1.21,-1.04 r0.5
  circle w0.3: c1.21,3.12 r0.5
  circle w0.3: c0,1.04 r0.5
  circle w0.3: c2.41,1.04 r0.5
  circle w0.3: c3.62,3.12 r0.5
  circle w0.3: c3.62,-1.04 r0.5
  circle w0.3: c2.41,-3.12 r0.5
  circle w0.3: c4.82,1.04 r0.5
  circle w0.3: c6.03,3.12 r0.5
  circle w0.3: c6.03,-1.04 r0.5
  circle w0.3: c4.82,-3.12 r0.5
  circle w0.3: c7.23,1.04 r0.5
  circle w0.3: c8.44,3.12 r0.5
  circle w0.3: c8.44,-1.04 r0.5
  circle w0.3: c7.23,-3.12 r0.5
  circle w0.3: c9.64,1.04 r0.5
  circle w0.3: c10.85,3.12 r0.5
  circle w0.3: c10.85,-1.04 r0.5
  circle w0.3: c9.64,-3.12 r0.5
  circle w0.3: c12.05,1.04 r0.5
  circle w0.3: c13.26,3.12 r0.5
  circle w0.3: c13.26,-1.04 r0.5
  circle w0.3: c12.05,-3.12 r0.5
  circle w0.3: c14.46,1.04 r0.5
  circle w0.3: c15.67,3.12 r0.5
  circle w0.3: c15.67,-1.04 r0.5
  circle w0.3: c14.46,-3.12 r0.5
  circle w0.3: c16.87,1.04 r0.5
  circle w0.3: c18.08,3.12 r0.5
  circle w0.3: c18.08,-1.04 r0.5
  circle w0.3: c16.87,-3.12 r0.5
  circle w0.3: c19.28,1.04 r0.5
  circle w0.3: c20.49,3.12 r0.5
  circle w0.3: c20.49,-1.04 r0.5
  circle w0.3: c19.28,-3.12 r0.5
  circle w0.3: c21.69,1.04 r0.5
  circle w0.3: c22.9,3.12 r0.5
  circle w0.3: c22.9,-1.04 r0.5
  circle w0.3: c21.69,-3.12 r0.5
  circle w0.3: c-2.41,1.04 r0.5
  circle w0.3: c-1.2,3.12 r0.5
  circle w0.3: c-1.2,-1.04 r0.5
  circle w0.3: c-2.41,-3.12 r0.5
  circle w0.3: c-4.82,1.04 r0.5
  circle w0.3: c-3.61,3.12 r0.5
  circle w0.3: c-3.61,-1.04 r0.5
  circle w0.3: c-4.82,-3.12 r0.5
  circle w0.3: c-7.23,1.04 r0.5
  circle w0.3: c-6.02,3.12 r0.5
  circle w0.3: c-6.02,-1.04 r0.5
  circle w0.3: c-7.23,-3.12 r0.5
  circle w0.3: c-9.64,1.04 r0.5
  circle w0.3: c-8.43,3.12 r0.5
  circle w0.3: c-8.43,-1.04 r0.5
  circle w0.3: c-9.64,-3.12 r0.5
  circle w0.3: c-12.05,1.04 r0.5
  circle w0.3: c-10.84,3.12 r0.5
  circle w0.3: c-10.84,-1.04 r0.5
  circle w0.3: c-12.05,-3.12 r0.5
  circle w0.3: c-14.46,1.04 r0.5
  circle w0.3: c-13.25,3.12 r0.5
  circle w0.3: c-13.25,-1.04 r0.5
  circle w0.3: c-14.46,-3.12 r0.5
  circle w0.3: c-16.87,1.04 r0.5
  circle w0.3: c-15.66,3.12 r0.5
  circle w0.3: c-15.66,-1.04 r0.5
  circle w0.3: c-16.87,-3.12 r0.5
  circle w0.3: c-19.28,1.04 r0.5
  circle w0.3: c-18.07,3.12 r0.5
  circle w0.3: c-18.07,-1.04 r0.5
  circle w0.3: c-19.28,-3.12 r0.5
  circle w0.3: c-21.69,1.04 r0.5
  circle w0.3: c-20.48,3.12 r0.5
  circle w0.3: c-20.48,-1.04 r0.5
  circle w0.3: c-21.69,-3.12 r0.5
  circle w0.3: c-22.89,3.12 r0.5
  circle w0.3: c-22.89,-1.04 r0.5
  lines w0.1: -33.05,0 -28.05,0 ; -30.55,-2.5 -30.55,2.5 ; 28.05,0 33.05,0 ; 30.55,-2.5 30.55,2.5
  lines w0.3: -26.2,-4.2 -27.65,4 cw(c-26.15,4) -26.15,5.5 ; -26.2,5.5 26.2,5.5 ; -26.193,-4.149 ccw(c-24.7,-4) -24.7,-5.5 24.7,-5.5 ccw(c24.7,-4) 26.193,-4.149 ; 26.15,5.5 cw(c26.15,4) 27.65,4 26.2,-4.2 ; -33.5,-7.8 -33.5,7.8 33.5,7.8 33.5,-7.8 -33.5,-7.8
  text "20" at -26,2.5 h2.12
  text "1" at 24.25,2.5 h2.12
  text "78" at -25,-4 h2.12
  text "60" at 23,-3.75 h2.12
  text "39" at -25,0.25 h2.12
  text "21" at 23,0.5 h2.12
  text "40" at 24.25,-1.75 h2.12
  text "59" at -26,-1.75 h2.12
3D body: height 13.25, standoff -3.5, extent -33.647,-7.879 33.653,7.871

## 0956561X713 (DHS-78M) [mm]
pads (80):
  rrect50% 1.6x1.6 hole 1: 1(-22.9,3.12)
  round 1.6 hole 1: 2(-20.49,3.12) 3(-18.08,3.12) 4(-15.67,3.12) 5(-13.26,3.12) 6(-10.85,3.12) 7(-8.44,3.12) 8(-6.03,3.12) 9(-3.62,3.12) 10(-1.21,3.12) 11(1.2,3.12) 12(3.61,3.12) 13(6.02,3.12) 14(8.43,3.12) 15(10.84,3.12) 16(13.25,3.12) 17(15.66,3.12) 18(18.07,3.12) 19(20.48,3.12) 20(22.89,3.12) 21(-21.69,1.04) 22(-19.28,1.04) 23(-16.87,1.04) 24(-14.46,1.04) 25(-12.05,1.04) 26(-9.64,1.04) 27(-7.23,1.04) 28(-4.82,1.04) 29(-2.41,1.04) 30(0,1.04) 31(2.41,1.04) 32(4.82,1.04) 33(7.23,1.04) 34(9.64,1.04) 35(12.05,1.04) 36(14.46,1.04) 37(16.87,1.04) 38(19.28,1.04) 39(21.69,1.04) 40(-22.9,-1.04) 41(-20.49,-1.04) 42(-18.08,-1.04) 43(-15.67,-1.04) 44(-13.26,-1.04) 45(-10.85,-1.04) 46(-8.44,-1.04) 47(-6.03,-1.04) 48(-3.62,-1.04) 49(-1.21,-1.04) 50(1.2,-1.04) 51(3.61,-1.04) 52(6.02,-1.04) 53(8.43,-1.04) 54(10.84,-1.04) 55(13.25,-1.04) 56(15.66,-1.04) 57(18.07,-1.04) 58(20.48,-1.04) 59(22.89,-1.04) 60(-21.69,-3.12) 61(-19.28,-3.12) 62(-16.87,-3.12) 63(-14.46,-3.12) 64(-12.05,-3.12) 65(-9.64,-3.12) 66(-7.23,-3.12) 67(-4.82,-3.12) 68(-2.41,-3.12) 69(0,-3.12) 70(2.41,-3.12) 71(4.82,-3.12) 72(7.23,-3.12) 73(9.64,-3.12) 74(12.05,-3.12) 75(14.46,-3.12) 76(16.87,-3.12) 77(19.28,-3.12) 78(21.69,-3.12)
  round 6 hole 3.2: MH32(-30.55,0) MH32(30.55,0)
Top Overlay:
  lines w0.25: -24.25,8.3 -24.25,9 -23,9 -23,8.3 ; -34,-8.2 -34,8.3 34,8.3 34,-8.2 -34,-8.2
  text "1" at -24,5.75 h1.38
Mechanical 1:
  circle w0.3: c30.55,0 r1.5
  circle w0.3: c-30.55,0 r1.5
  circle w0.3: c0,-3.12 r0.5
  circle w0.3: c-1.21,-1.04 r0.5
  circle w0.3: c-1.21,3.12 r0.5
  circle w0.3: c0,1.04 r0.5
  circle w0.3: c-2.41,1.04 r0.5
  circle w0.3: c-3.62,3.12 r0.5
  circle w0.3: c-3.62,-1.04 r0.5
  circle w0.3: c-2.41,-3.12 r0.5
  circle w0.3: c-4.82,1.04 r0.5
  circle w0.3: c-6.03,3.12 r0.5
  circle w0.3: c-6.03,-1.04 r0.5
  circle w0.3: c-4.82,-3.12 r0.5
  circle w0.3: c-7.23,1.04 r0.5
  circle w0.3: c-8.44,3.12 r0.5
  circle w0.3: c-8.44,-1.04 r0.5
  circle w0.3: c-7.23,-3.12 r0.5
  circle w0.3: c-9.64,1.04 r0.5
  circle w0.3: c-10.85,3.12 r0.5
  circle w0.3: c-10.85,-1.04 r0.5
  circle w0.3: c-9.64,-3.12 r0.5
  circle w0.3: c-12.05,1.04 r0.5
  circle w0.3: c-13.26,3.12 r0.5
  circle w0.3: c-13.26,-1.04 r0.5
  circle w0.3: c-12.05,-3.12 r0.5
  circle w0.3: c-14.46,1.04 r0.5
  circle w0.3: c-15.67,3.12 r0.5
  circle w0.3: c-15.67,-1.04 r0.5
  circle w0.3: c-14.46,-3.12 r0.5
  circle w0.3: c-16.87,1.04 r0.5
  circle w0.3: c-18.08,3.12 r0.5
  circle w0.3: c-18.08,-1.04 r0.5
  circle w0.3: c-16.87,-3.12 r0.5
  circle w0.3: c-19.28,1.04 r0.5
  circle w0.3: c-20.49,3.12 r0.5
  circle w0.3: c-20.49,-1.04 r0.5
  circle w0.3: c-19.28,-3.12 r0.5
  circle w0.3: c-21.69,1.04 r0.5
  circle w0.3: c-22.9,3.12 r0.5
  circle w0.3: c-22.9,-1.04 r0.5
  circle w0.3: c-21.69,-3.12 r0.5
  circle w0.3: c2.41,1.04 r0.5
  circle w0.3: c1.2,3.12 r0.5
  circle w0.3: c1.2,-1.04 r0.5
  circle w0.3: c2.41,-3.12 r0.5
  circle w0.3: c4.82,1.04 r0.5
  circle w0.3: c3.61,3.12 r0.5
  circle w0.3: c3.61,-1.04 r0.5
  circle w0.3: c4.82,-3.12 r0.5
  circle w0.3: c7.23,1.04 r0.5
  circle w0.3: c6.02,3.12 r0.5
  circle w0.3: c6.02,-1.04 r0.5
  circle w0.3: c7.23,-3.12 r0.5
  circle w0.3: c9.64,1.04 r0.5
  circle w0.3: c8.43,3.12 r0.5
  circle w0.3: c8.43,-1.04 r0.5
  circle w0.3: c9.64,-3.12 r0.5
  circle w0.3: c12.05,1.04 r0.5
  circle w0.3: c10.84,3.12 r0.5
  circle w0.3: c10.84,-1.04 r0.5
  circle w0.3: c12.05,-3.12 r0.5
  circle w0.3: c14.46,1.04 r0.5
  circle w0.3: c13.25,3.12 r0.5
  circle w0.3: c13.25,-1.04 r0.5
  circle w0.3: c14.46,-3.12 r0.5
  circle w0.3: c16.87,1.04 r0.5
  circle w0.3: c15.66,3.12 r0.5
  circle w0.3: c15.66,-1.04 r0.5
  circle w0.3: c16.87,-3.12 r0.5
  circle w0.3: c19.28,1.04 r0.5
  circle w0.3: c18.07,3.12 r0.5
  circle w0.3: c18.07,-1.04 r0.5
  circle w0.3: c19.28,-3.12 r0.5
  circle w0.3: c21.69,1.04 r0.5
  circle w0.3: c20.48,3.12 r0.5
  circle w0.3: c20.48,-1.04 r0.5
  circle w0.3: c21.69,-3.12 r0.5
  circle w0.3: c22.89,3.12 r0.5
  circle w0.3: c22.89,-1.04 r0.5
  lines w0.1: -33.05,0 -28.05,0 ; -30.55,-2.5 -30.55,2.5 ; 28.05,0 33.05,0 ; 30.55,-2.5 30.55,2.5
  lines w0.3: -26.2,-4.2 -27.65,4 cw(c-26.15,4) -26.15,5.5 ; -26.2,5.5 26.2,5.5 ; -26.193,-4.149 ccw(c-24.7,-4) -24.7,-5.5 24.7,-5.5 ccw(c24.7,-4) 26.193,-4.149 ; 26.15,5.5 cw(c26.15,4) 27.65,4 26.2,-4.2 ; -33.5,-7.8 -33.5,7.8 33.5,7.8 33.5,-7.8 -33.5,-7.8
  text "20" at 24.25,2.5 h2.12
  text "1" at -25.5,2.5 h2.12
  text "78" at 23,-3.75 h2.12
  text "60" at -24.75,-3.75 h2.12
  text "39" at 23,0.5 h2.12
  text "21" at -25,0.5 h2.12
  text "40" at -26,-1.75 h2.12
  text "59" at 24.25,-1.5 h2.12

## 0965161X7X3 (DB-9M) [mm]
pads (11):
  rrect50% 1.7x1.7 hole 1: 1(-5.48,1.42)
  round 1.7 hole 1: 2(-2.74,1.42) 3(0,1.42) 4(2.74,1.42) 5(5.48,1.42) 6(-4.11,-1.42) 7(-1.37,-1.42) 8(1.37,-1.42) 9(4.11,-1.42)
  round 6 hole 3.2: MH32(-12.5,0) MH32(12.5,0)
Top Overlay:
  lines w0.25: -6.25,6.4 -6.25,7 -5,7 -5,6.4 ; -16,-6.4 16,-6.4 16,6.4 -16,6.4 -16,-6.4
  text "1" at -5.25,3.75 h1.38
Mechanical 1:
  circle w0.3: c12.5,0 r1.5
  circle w0.3: c-12.5,0 r1.5
  circle w0.3: c0,1.42 r0.5
  circle w0.3: c1.37,-1.42 r0.5
  circle w0.3: c2.74,1.42 r0.5
  circle w0.3: c4.11,-1.42 r0.5
  circle w0.3: c5.48,1.42 r0.5
  circle w0.3: c-2.74,1.42 r0.5
  circle w0.3: c-1.37,-1.42 r0.5
  circle w0.3: c-4.11,-1.42 r0.5
  circle w0.3: c-5.48,1.42 r0.5
  lines w0.1: -15,0 -10,0 ; -12.5,-2.5 -12.5,2.5 ; 10,0 15,0 ; 12.5,-2.5 12.5,2.5
  lines w0.3: -7,-2.6 -7.9,2.5 cw(c-6.4,2.5) -6.4,4 6.4,4 cw(c6.4,2.5) 7.9,2.5 7,-2.7 ; -7,-2.5 ccw(c-5.5,-2.5) -5.5,-4 5.5,-4 ccw(c5.5,-2.5) 7,-2.5 ; -15.5,-6.3 15.5,-6.3 15.5,6.3 -15.5,6.3 -15.5,-6.3
  text "6" at -6,-3 h2.12
  text "9" at 5.5,-3 h2.12
  text "1" at -7.25,2 h2.12
  text "5" at 6.5,2 h2.12

## 0965261X7X3 (DB-15M) [mm]
pads (17):
  rrect50% 1.7x1.7 hole 1: 1(-9.59,1.42)
  round 1.7 hole 1: 2(-6.85,1.42) 3(-4.11,1.42) 4(-1.37,1.42) 5(1.37,1.42) 6(4.11,1.42) 7(6.85,1.42) 8(9.59,1.42) 9(-8.22,-1.42) 10(-5.48,-1.42) 11(-2.74,-1.42) 12(0,-1.42) 13(2.74,-1.42) 14(5.48,-1.42) 15(8.22,-1.42)
  round 6 hole 3.2: MH32(-16.65,0) MH32(16.65,0)
Top Overlay:
  lines w0.25: -10.4,6.4 -10.4,7 -9.15,7 -9.15,6.4 ; -20.15,-6.4 -20.15,6.4 20.15,6.4 20.15,-6.4 -20.15,-6.4
  text "1" at -10,3.75 h1.38
Mechanical 1:
  circle w0.3: c-1.37,1.42 r0.5
  circle w0.3: c1.37,1.42 r0.5
  circle w0.3: c0,-1.42 r0.5
  circle w0.3: c-16.65,0 r1.5
  circle w0.3: c16.65,0 r1.5
  circle w0.3: c4.11,1.42 r0.5
  circle w0.3: c6.85,1.42 r0.5
  circle w0.3: c9.59,1.42 r0.5
  circle w0.3: c-4.11,1.42 r0.5
  circle w0.3: c-6.85,1.42 r0.5
  circle w0.3: c-9.59,1.42 r0.5
  circle w0.3: c2.74,-1.42 r0.5
  circle w0.3: c5.48,-1.42 r0.5
  circle w0.3: c8.22,-1.42 r0.5
  circle w0.3: c-2.74,-1.42 r0.5
  circle w0.3: c-5.48,-1.42 r0.5
  circle w0.3: c-8.22,-1.42 r0.5
  lines w0.1: -19.15,0 -14.15,0 ; -16.65,-2.5 -16.65,2.5 ; 14.15,0 19.15,0 ; 16.65,-2.5 16.65,2.5
  lines w0.3: -11.15,-2.6 -12.05,2.5 cw(c-10.55,2.5) -10.55,4 10.55,4 cw(c10.55,2.5) 12.05,2.5 11.15,-2.7 ; -11.15,-2.5 ccw(c-9.65,-2.5) -9.65,-4 9.65,-4 ccw(c9.65,-2.5) 11.15,-2.5 ; -19.75,-6.3 -19.75,6.3 19.75,6.3 19.75,-6.3 -19.75,-6.3
  text "8" at 10.65,2 h2.12
  text "1" at -11.4,2 h2.12
  text "15" at 9,-3 h2.12
  text "9" at -10.15,-3 h2.12